# Altium footprint library ThanhNT.PcbLib: 579 footprints (part 33 of 37)
Each footprint in its own frame and in the unit in brackets; x right, y up, seen from the top. Pads: shape width x height; smd on the part's side, far side on the other; paste and mask are expansions set on the pad; w line width, h text height; cw(c..) or ccw(c..) is an arc to the next point about the centre after c.
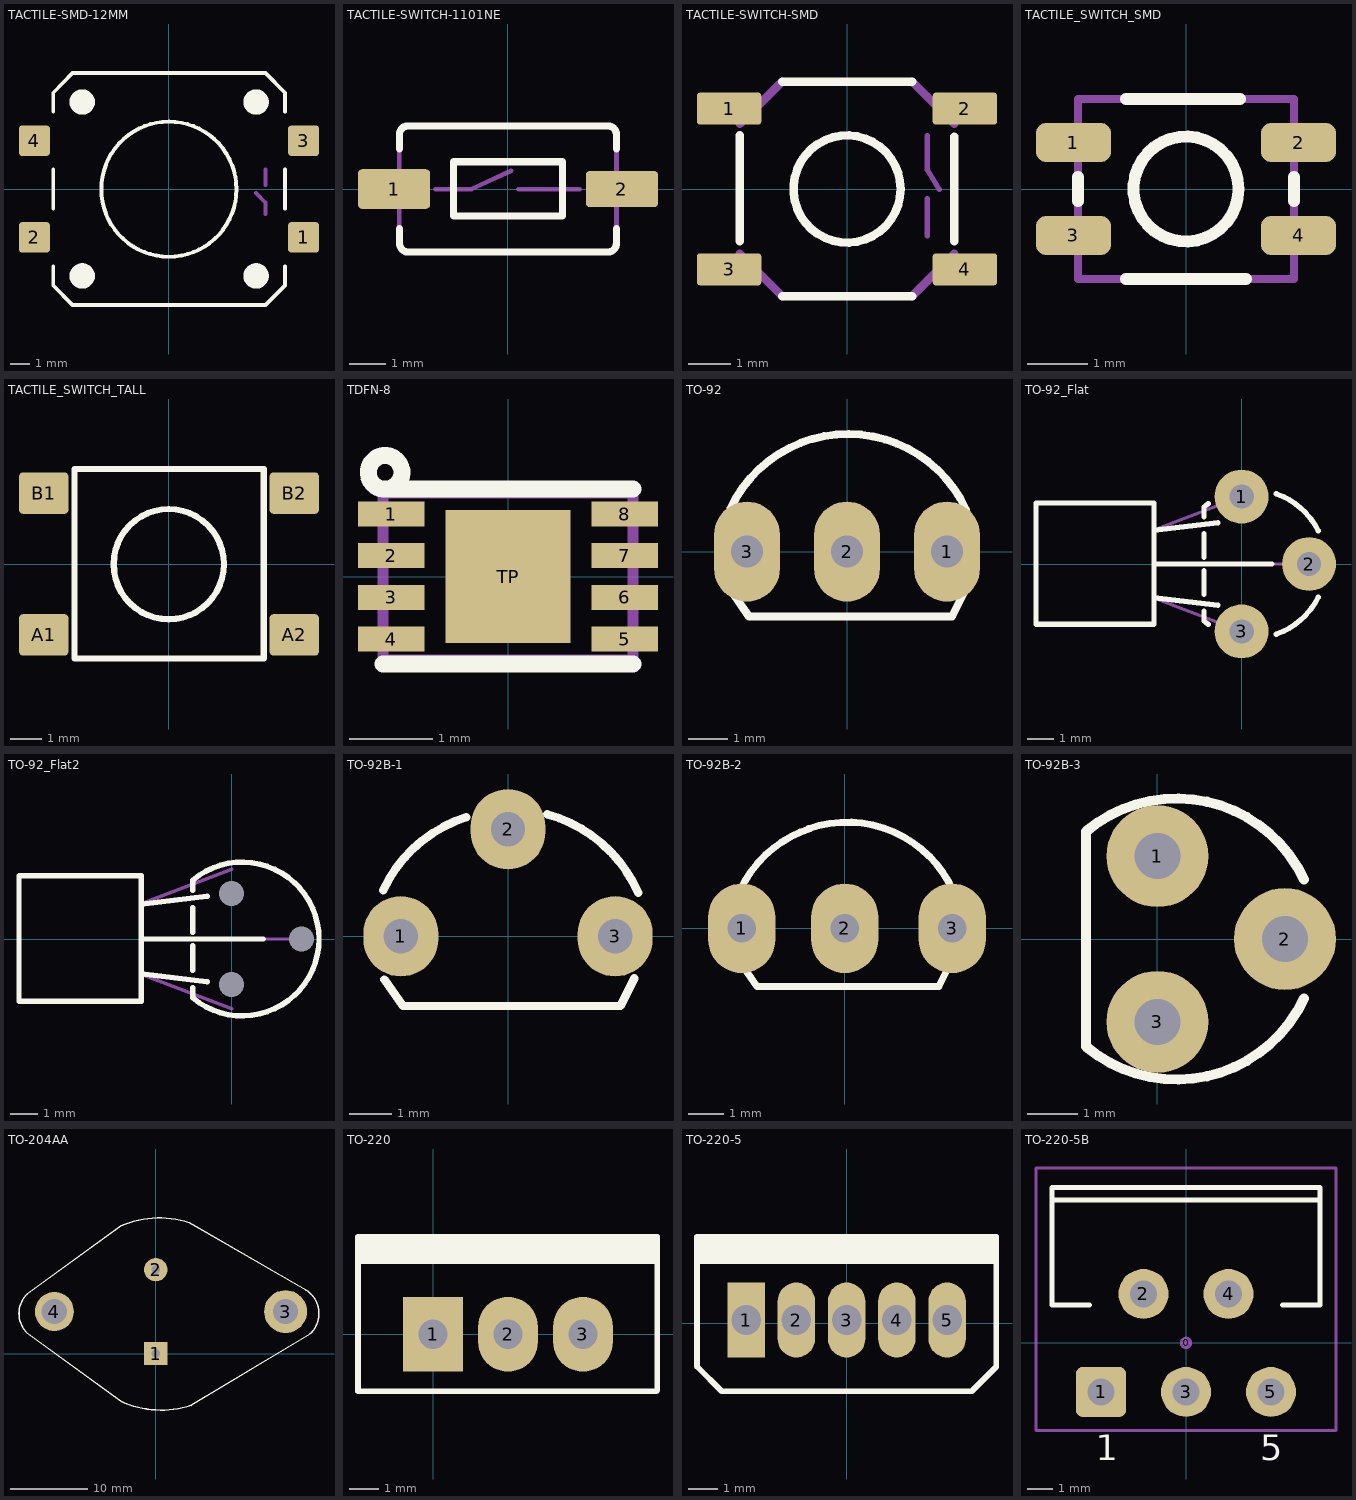
[diagram p32: the footprints below, top view; thin cyan lines are the x and y axes]

## TACTILE-SMD-12MM [mil]
pads (4):
  rrect20% 63x62 smd: 1(275,-98.43) 2(-274.61,-98.43) 3(275,99) 4(-274.61,99)
Top Overlay:
  circle w28: c-177.17,-177.17 r12
  circle w28: c178,-177.17 r12
  circle w28: c178,178 r12
  circle w28: c-177.17,178 r12
  circle w8: c0,0 r138
  lines w7.87: -236.22,-157.48 -236.22,-196.85 -196.85,-236.22 197,-236.22 237,-196.85 237,-157.48 ; -236.22,-39.37 -236.22,40 ; -236.22,158 -236.22,197 -196.85,237 197,237 237,197 237,158 ; 237,-39.37 237,40
Mechanical 16:
  lines w8: 178,-7.87 197,-27.56 197,-51.18 ; 197,8 197,40
3D body "User Library-SWT_12x12_SMD.STEP": height 157.98, standoff 0.5, extent -264.76,-235 264.76,237.44

## TACTILE-SWITCH-1101NE [mm]
pads (2):
  rrect20% 2x1.1 smd: 1(-3.15,0)
  rrect20% 2x1 smd: 2(3.175,0)
Top Overlay:
  lines w0.2: -3,-1.1 -3,-1.5 ccw(c-2.75,-1.5) -2.75,-1.75 2.769,-1.75 ccw(c2.771,-1.498) 3.023,-1.5 3.023,-1.1 ; -3,1.118 -3,1.524 cw(c-2.761,1.513) -2.75,1.753 2.769,1.753 cw(c2.781,1.511) 3.023,1.524 3.023,1.118
  lines w0.203: -1.5,-0.75 -1.5,0.762 1.524,0.762 1.524,-0.75 -1.5,-0.75
Mechanical 16:
  lines w0.127: -3,-1.1 -3,1.118 ; -2,0 -1,0 0.102,0.508 ; 0.305,0 2.007,0 ; 3.023,-1.1 3.023,1.118
3D body "User Library-SWT-39.STEP": height 2.5, standoff 0, extent -4,-1.82 4,1.88

## TACTILE-SWITCH-SMD [mil]
pads (4):
  rrect20% 60x30 smd: 1(-110,75) 2(110,75) 3(-110,-75) 4(110,-75)
Top Overlay:
  circle w7.87: c0,0 r50
  lines w7.87: -100,-48.82 -100,50 ; -60.63,-100 61,-100 ; -60.63,100 61,100 ; 100,-48.82 100,49
Mechanical 16:
  lines w5: 75,-43.9 75,-9.06 ; 75,50 75,18 86,-0.39
  lines w8: -100,-60.63 -60.63,-100 ; -100,61 -60.63,100 ; 61,-100 100,-60.63 ; 61,100 100,61
3D body "43432.stp": height 59.56, standoff 0.5, extent -125.98,-102.35 125.99,102.37

## TACTILE_SWITCH_SMD [mm]
pads (4):
  rrect50% 1.25x0.65 smd: 1(-1.875,0.775) 2(1.875,0.775) 3(-1.875,-0.775) 4(1.875,-0.775)
Top Overlay:
  circle w0.2: c0,0 r0.875
  lines w0.2: -1.8,-0.2 -1.8,0.2 ; -1,-1.5 1,-1.5 ; -1,1.5 0.9,1.5 ; 1.8,-0.2 1.8,0.2
Mechanical 16:
  lines w0.127: -1.8,-1.5 1.8,-1.5 1.8,1.5 -1.8,1.5 -1.8,-1.5

## TACTILE_SWITCH_TALL [mil]
pads (4):
  rrect20% 62x52 smd: A1(-156.5,-88.58) A2(157,-88.58) B1(-156.5,89) B2(157,89)
Top Overlay:
  circle w7.87: c0,0 r69
  lines w7.87: -118.11,-118.11 119,-118.11 119,119 -118.11,119 -118.11,-118.11
3D body "User Library-PTS645SL50SMTR92-LFS.STEP": height 196.85, standoff 0, extent -179.16,-116.11 175.17,120.11

## TDFN-8 [mil] "2x3mm"
pads (9):
  rect 31.5x11.81 smd: 1(-55.12,29.53) 2(-55.12,9.84) 3(-55.12,-9.84) 4(-55.12,-29.53) 5(55.12,-29.53) 6(55.12,-9.84) 7(55.12,9.84) 8(55.12,29.53)
  rect 59.06x62.99 smd: TP(0,0)
Top Overlay:
  lines w5: -59.06,41.34 -57.09,41.34
  lines w8: -59.06,-41.34 59.06,-41.34 ; -59.06,41.34 cw(c-58.08,49.22) -57.09,41.34 59.06,41.34
Top Paste:
  rectangle: -13,-13 13,13
Top Solder:
  rectangle: -70.87,23.62 -39.37,35.43
  rectangle: -70.87,23.62 -39.37,35.43
  rectangle: -70.87,-15.75 -39.37,-3.94
  rectangle: -70.87,3.94 -39.37,15.75
  rectangle: -70.87,-35.43 -39.37,-23.62
  rectangle: 39.37,23.62 70.87,35.43
  rectangle: 39.37,3.94 70.87,15.75
  rectangle: 39.37,-15.75 70.87,-3.94
  rectangle: 39.37,-35.43 70.87,-23.62
  rectangle: -34.06,-37.01 34.06,37.01
Mechanical 16:
  lines w5: -59.06,-39.37 -59.06,39.37 59.06,39.37 59.06,-39.37 -59.06,-39.37
3D body "User Library-8-TDFN (2x3.STEP": height 29.29, standoff -0.25, extent -59.09,-39.41 59.1,39.41

## TO-92 [mil] "TO-92"
height 200
pads (3):
  oval 66x100 hole 32: 1(100,0) 2(0,0) 3(-100,0)
Top Overlay:
  lines w7.87: -116.52,43.21 cw(c0.97,-12.43) 119.08,41.88 ; -115.34,-40.24 -98,-65 105,-65 118,-39
3D body "SW3dPS-TO92.STEP": height 385.04, standoff -59.79, extent -110,-60.56 107.74,100

## TO-92_Flat [mil]
height 151.57
pads (3):
  round 80 hole 36: 1(0,100) 2(100,0) 3(0,-100)
Top Overlay:
  lines w7.87: -130.03,0 45,0 ; -130,-50 -35.14,-61.16 ; -130,50 -35.14,61.16 ; -55.86,-70 -55.86,-84.45 ccw(c15,0) -49.54,-89.37 ; -55.86,-45 -55.86,-10 ; -55.86,10 -55.86,45 ; -55.86,70 -55.86,84.45 cw(c15,0) -49.54,89.37 ; 51.42,-104.05 ccw(c15,0) 113.6,-49.3 ; 51.42,104.05 cw(c15,0) 113.6,49.3 ; -305.03,-89.45 -305.03,90.55 -130.03,90.55 -130.03,-89.45 -305.03,-89.45
Mechanical 13:
  lines w5: -130,-50.44 0,-100 ; -130,0.1 100,0 ; -130,50.44 0,100 ; -305,-90 -305,90 -130,90 -130,-90 -305,-90
3D body "TO-92_Flat.STEP": height 141.73, standoff -100, extent -307.08,-109.84 109.85,109.85

## TO-92_Flat2 [mil]
height 151.57
pads (3):
  round 0 / inner round 0 / far side round 80 hole 36 unplated: 1(0,65) 2(100,0) 3(0,-65)
Top Overlay:
  lines w7.87: -130.03,0 45,0 ; -130,-50 -35.14,-61.16 ; -130,50 -35.14,61.16 ; -55.86,-70 -55.86,-84.45 ccw(c15,0) -55.86,84.45 -55.86,70 ; -55.86,-45 -55.86,-10 ; -55.86,10 -55.86,45 ; -305.03,-89.45 -305.03,90.55 -130.03,90.55 -130.03,-89.45 -305.03,-89.45
Mechanical 13:
  lines w5: -130,-50.44 0,-100 ; -130,0.1 100,0 ; -130,50.44 0,100 ; -305,-90 -305,90 -130,90 -130,-90 -305,-90
3D body "TO-92_Flat_Narrow.STEP": height 141.73, standoff -100, extent -307.08,-94.48 109.85,94.5

## TO-92B-1 [mil] "TO-92"
height 200
pads (3):
  oval 70x75 hole 32: 1(-100,0) 2(0,100) 3(100,0)
Top Overlay:
  lines w7.87: -116.52,43.21 cw(c0.97,-12.43) -38.82,111.34 ; -115.34,-40.24 -98,-65 105,-65 118,-39 ; 36.81,113.84 cw(c2.42,-11.53) 121.49,40.65

## TO-92B-2 [mil] "TO-92"
height 200
pads (3):
  oval 75x100 hole 32: 1(-115,0) 2(0,0) 3(120,0)
Top Overlay:
  lines w7.87: -116.52,43.21 cw(c0.97,-12.43) -38.82,111.34 ; -115.34,-40.24 -98,-65 105,-65 118,-39 ; -40.42,111.21 cw(c2.42,-11.53) 121.49,40.65
3D body "SW3dPS-TO92.STEP": height 385.04, standoff -59.79, extent -112.74,-65.56 105,95

## TO-92B-3 [mil]
height 397.64
pads (3):
  round 80 hole 36: 1(0,65) 2(100,0) 3(0,-65)
Top Overlay:
  lines w7.87: 114.91,-46.59 cw(c15,0) -55.86,-84.45 -55.86,84.45 cw(c15,0) 114.91,46.59
3D body "TO-92_A.stp": height 404.72, standoff -100, extent -54.52,-94.57 107.49,94.56

## TO-204AA [mil] "Pin For 2N3055, 2N2955"
pads (4):
  rect 120x120 hole 45: 1(0,0)
  round 120 hole 45: 2(0,430)
  round 220 hole 130: 3(665,215)
  round 200 hole 130: 4(-520,215)
Top Overlay:
  lines w7.87: -660,105 cw(c-560,205) -660,305 -179.46,654.16 ; -659.88,104.89 -178.69,-244.72 ; -179.53,654.34 cw(c18.37,195.17) 171.59,671.11 ; -178.9,-245.19 ccw(c28.37,209.83) 180.47,-266.47 ; 171.46,670.71 769.34,325.52 ; 180.28,-266.15 789.88,100.13 ccw(c695,205) 769.25,325.36
3D body "SW3dPS-2N3055_New.STEP": height 350.39, standoff -472.44, extent -690.9,-297.81 854.63,725.81

## TO-220 [mil] "TO-220 - 1-2-3"
height 200
pads (3):
  rect 80x100 hole 39: 1(0,0)
  oval 80x100 hole 39: 2(100,0) 3(200,0)
Top Overlay:
  rectangle: -99,94 300,130
  lines w7.87: -100,-76 298,-76 ; -100,-75 -100,130 299,130 299,-75 ; 298,107 299,93
3D body "SW3dPS-TO220AB.STEP": height 904.72, standoff -250, extent -119,-64 322.46,120.65

## TO-220-5 [mil] "TO-220 - 1-2-3"
height 200
pads (5):
  rect 50x100 hole 39.37: 1(-134,4)
  oval 50x100 hole 39.37: 2(-67,4) 3(0,4) 4(67,4) 5(134,4)
Top Overlay:
  rectangle: -198.5,79 200.5,115
  lines w7.87: 198.5,92 199.5,78 ; -199.5,-58 -199.5,115 199.5,115 199.5,-58.5 167,-91 -166.5,-91 -199.5,-58

## TO-220-5B [mm] "TO, Thru-Hole, Vertical, Heatsink Mounted; 5 Bent Staggered Leads; Pitch 1.7mm"
height 21.1
pads (6):
  round 0.5 on Mech15: 0(0,0)
  rrect25% 2x2 hole 1.092: 1(-3.4,-1.96)
  round 2 hole 1.092: 2(-1.7,1.96) 3(0,-1.96) 4(1.7,1.96) 5(3.4,-1.96)
Top Overlay:
  lines w0.2: -5.35,5.71 5.35,5.71 ; -3.854,1.51 -5.35,1.51 -5.35,6.21 5.35,6.21 5.35,1.51 3.854,1.51
  text "5" at 2.98,-4.685 h1.02
  text "1" at -3.62,-4.685 h1.02
Mechanical 15:
  lines w0.127: -6,-3.5 6,-3.5 6,7 -6,7 -6,-3.5
3D body "User Library-TO220-5B PCB.STEP": height 20.05, standoff -2.61, extent -5.055,-2.188 5.105,6.311